# Altium footprint library hphonglib.PcbLib: 703 footprints (part 42 of 44)
Each footprint in its own frame and in the unit in brackets; x right, y up, seen from the top. Pads: shape width x height; smd on the part's side, far side on the other; paste and mask are expansions set on the pad; w line width, h text height; cw(c..) or ccw(c..) is an arc to the next point about the centre after c.
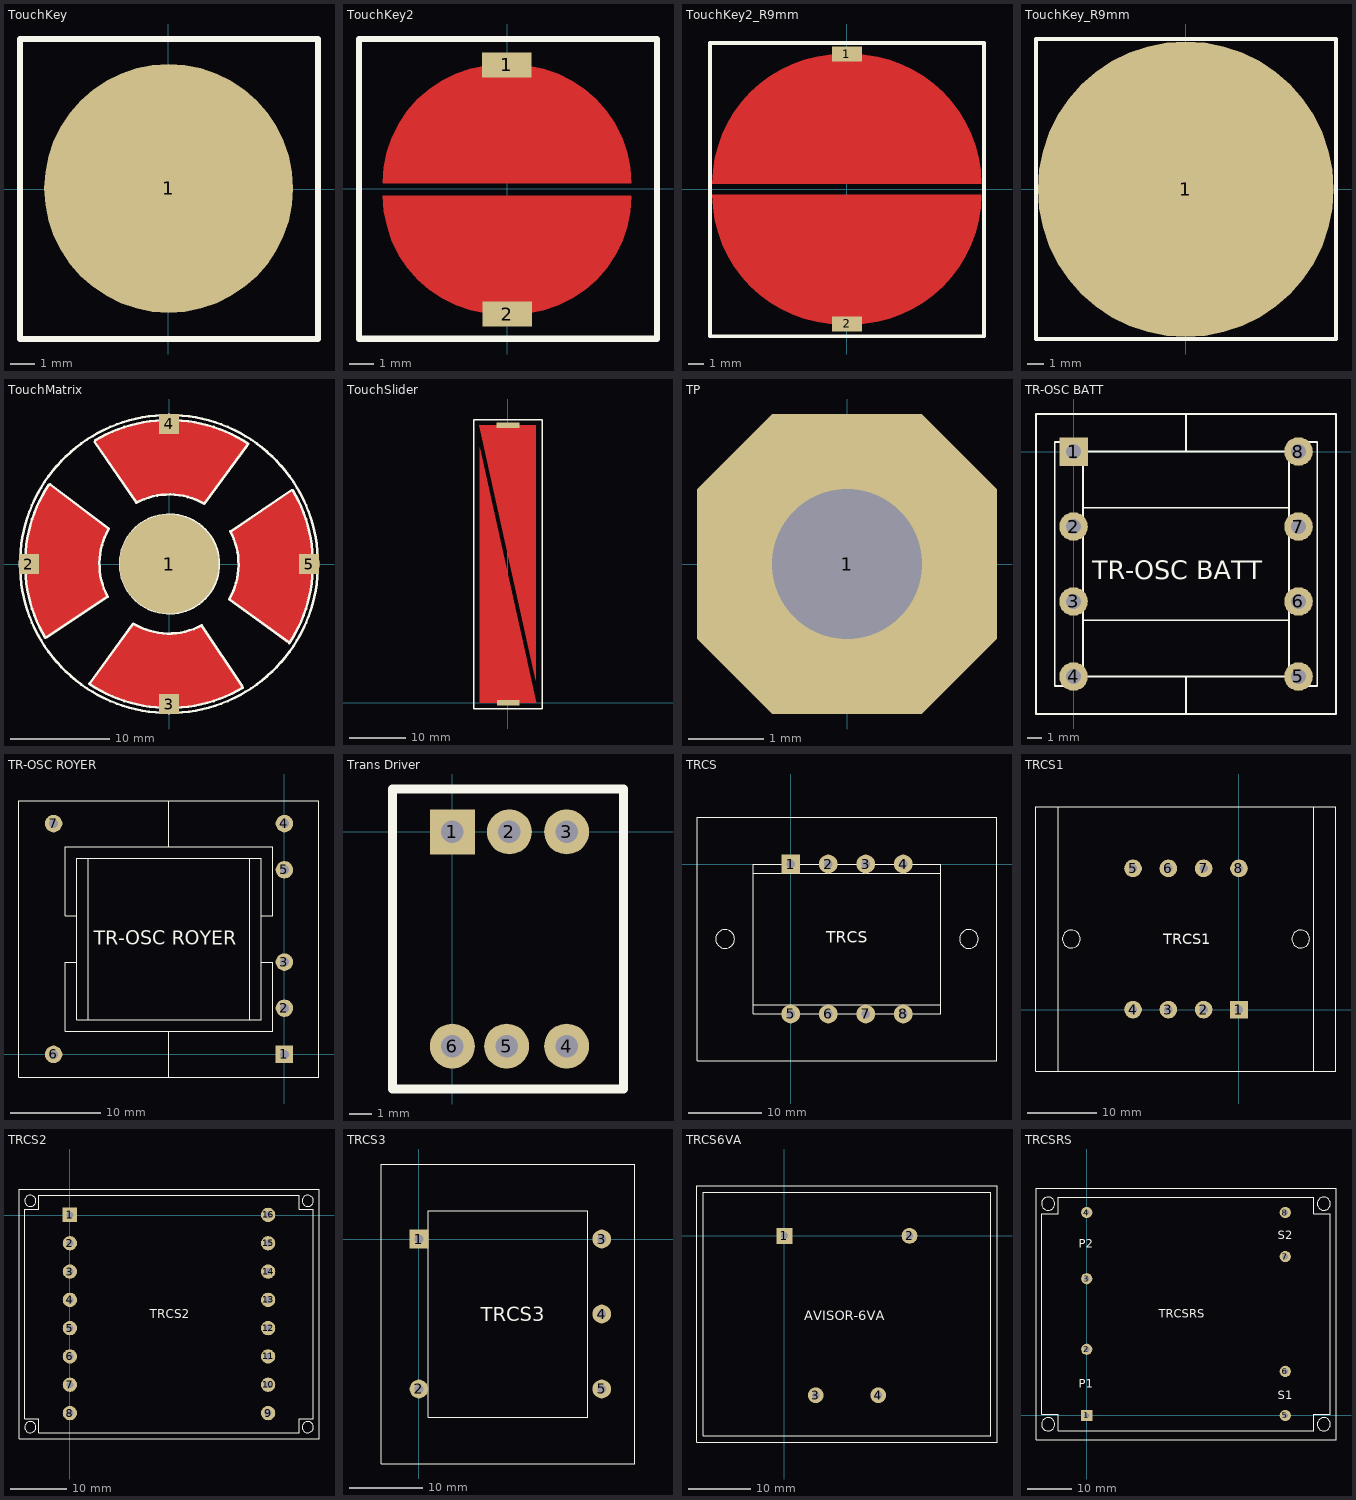
[diagram p41: the footprints below, top view; thin cyan lines are the x and y axes]

## TouchKey [mm] "Radius 5mm"
pads (1):
  round 10 smd mask+0: 1(0.025,0.025)
Top Overlay:
  lines w0.254: -5.95,-6.025 6.025,-6.025 6.025,6.025 -5.95,6.025 -5.95,-6.025

## TouchKey2 [mm] "Radius 5mm"
pads (2):
  rect 2x1 smd mask+0: 1(-0.012,4.983) 2(0.012,-5.034)
Top Layer:
  region: 0.253,-5.039 0.871,-4.999 1.479,-4.878 2.065,-4.679 2.621,-4.405 3.136,-4.061 3.601,-3.652 4.01,-3.187 4.354,-2.671 4.628,-2.116 4.827,-1.529 4.948,-0.922 4.989,-0.304 4.978,-0.304 4.978,-0.279 -4.989,-0.279 -4.948,-0.901 -4.826,-1.511 -4.626,-2.101 -4.351,-2.659 -4.005,-3.177 -3.594,-3.645 -3.126,-4.056 -2.609,-4.402 -2.05,-4.677 -1.461,-4.877 -0.85,-4.999 -0.229,-5.039 -0.229,-5.029
  region: -0.253,4.989 -0.871,4.948 -1.479,4.827 -2.065,4.628 -2.621,4.354 -3.136,4.01 -3.601,3.601 -4.01,3.136 -4.354,2.621 -4.628,2.065 -4.827,1.479 -4.948,0.871 -4.989,0.253 -4.978,0.253 -4.978,0.229 4.989,0.229 4.948,0.85 4.826,1.461 4.626,2.05 4.351,2.609 4.005,3.126 3.594,3.594 3.126,4.005 2.609,4.351 2.05,4.626 1.461,4.826 0.85,4.948 0.229,4.989 0.229,4.978
Top Overlay:
  lines w0.254: -5.95,-6.025 6.025,-6.025 6.025,6.025 -5.95,6.025 -5.95,-6.025

## TouchKey2_R9mm [mm] "Radius 9mm"
pads (2):
  rect 2x1 smd paste+0 mask+0: 1(0,8.992) 2(0.025,-8.992)
Top Layer:
  region: -0.33,8.977 -1.175,8.935 -2.012,8.811 -2.833,8.605 -3.629,8.32 -4.394,7.959 -5.12,7.524 -5.799,7.02 -6.426,6.452 -6.994,5.825 -7.498,5.145 -7.933,4.42 -8.295,3.655 -8.58,2.858 -8.786,2.037 -8.91,1.201 -8.951,0.356 -8.941,0.356 8.951,0.356 8.91,1.201 8.786,2.037 8.58,2.858 8.295,3.655 7.933,4.42 7.498,5.145 6.994,5.825 6.426,6.452 5.799,7.02 5.12,7.524 4.394,7.959 3.629,8.32 2.833,8.605 2.012,8.811 1.175,8.935 0.33,8.977 0.33,8.966
  region: 0.33,-9.002 1.175,-8.96 2.012,-8.836 2.833,-8.631 3.629,-8.346 4.394,-7.984 5.12,-7.549 5.799,-7.045 6.426,-6.477 6.994,-5.85 7.498,-5.171 7.933,-4.445 8.295,-3.68 8.58,-2.884 8.786,-2.063 8.91,-1.226 8.951,-0.381 8.941,-0.381 -8.951,-0.381 -8.91,-1.226 -8.786,-2.063 -8.58,-2.884 -8.295,-3.68 -7.933,-4.445 -7.498,-5.171 -6.994,-5.85 -6.426,-6.477 -5.799,-7.045 -5.12,-7.549 -4.394,-7.984 -3.629,-8.346 -2.833,-8.631 -2.012,-8.836 -1.175,-8.96 -0.33,-9.002 -0.33,-8.992
Top Overlay:
  lines w0.254: -9.119,-9.804 9.144,-9.804 9.144,9.728 -9.119,9.728 -9.119,-9.804

## TouchKey_R9mm [mm] "Radius 9mm"
pads (1):
  round 18 smd paste+0 mask+0: 1(0,0)
Top Overlay:
  lines w0.254: -9.119,-9.119 -9.119,9.144 9.144,9.144 9.144,-9.119 -9.119,-9.119

## TouchMatrix [mm]
pads (5):
  round 10 smd paste+0 mask+0: 1(0,0)
  rect 2x2 smd paste+0 mask+0: 2(-14.097,0) 3(0,-14.097) 4(0,14.097) 5(14.097,0)
Top Layer:
  region: -3.302,6.223 -7.366,12.192 -7.373,12.319 -7.344,12.468 -7.26,12.594 -7.134,12.678 -6.985,12.707 -6.985,12.7 -4.699,13.716 -1.905,14.351 0.635,14.478 3.175,14.097 5.08,13.589 7.62,12.324 7.719,12.304 7.803,12.248 7.859,12.164 7.879,12.065 7.874,12.065 7.874,11.811 3.556,6.096 2.54,6.604 1.27,6.858 0.254,7.112 -1.27,6.985 -2.667,6.477
  region: 6.223,3.302 12.192,7.366 12.319,7.373 12.468,7.344 12.594,7.26 12.678,7.134 12.707,6.985 12.7,6.985 13.716,4.699 14.351,1.905 14.478,-0.635 14.097,-3.175 13.589,-5.08 12.324,-7.62 12.304,-7.719 12.248,-7.803 12.164,-7.859 12.065,-7.879 12.065,-7.874 11.811,-7.874 6.096,-3.556 6.604,-2.54 6.858,-1.27 7.112,-0.254 6.985,1.27 6.477,2.667
  region: -6.223,-3.302 -12.192,-7.366 -12.319,-7.373 -12.468,-7.344 -12.594,-7.26 -12.678,-7.134 -12.707,-6.985 -12.7,-6.985 -13.716,-4.699 -14.351,-1.905 -14.478,0.635 -14.097,3.175 -13.589,5.08 -12.324,7.62 -12.304,7.719 -12.248,7.803 -12.164,7.859 -12.065,7.879 -12.065,7.874 -11.811,7.874 -6.096,3.556 -6.604,2.54 -6.858,1.27 -7.112,0.254 -6.985,-1.27 -6.477,-2.667
  region: 3.302,-6.223 7.366,-12.192 7.373,-12.319 7.344,-12.468 7.26,-12.594 7.134,-12.678 6.985,-12.707 6.985,-12.7 4.699,-13.716 1.905,-14.351 -0.635,-14.478 -3.175,-14.097 -5.08,-13.589 -7.62,-12.324 -7.719,-12.304 -7.803,-12.248 -7.859,-12.164 -7.879,-12.065 -7.874,-12.065 -7.874,-11.811 -3.556,-6.096 -2.54,-6.604 -1.27,-6.858 -0.254,-7.112 1.27,-6.985 2.667,-6.477
Top Overlay:
  circle w0.254: c0,0 r15
  circle w0.254: c0.051,0 r4.973
  lines w0.254: -12.445,-7.441 cw(c0,0) -12.099,7.992 ; -12.319,-7.366 -6.223,-3.302 ; -11.938,8.001 -6.096,3.556 ; -8.001,-12.065 -3.683,-6.096 ; -7.992,-12.099 ccw(c0,0) 7.441,-12.445 ; -7.493,12.319 -3.299,6.225 ; -7.441,12.445 cw(c0,0) 7.992,12.099 ; -6.177,-3.278 cw(c0,0.015) -6.053,3.531 ; -3.605,-6.009 ccw(c-0.015,0) 3.292,-6.17 ; -3.292,6.17 cw(c0.015,0) 3.531,6.053 ; 3.302,-6.223 7.366,-12.319 ; 3.556,6.096 7.874,11.938 ; 6.053,-3.531 ccw(c0,-0.015) 6.17,3.292 ; 6.096,-3.556 12.065,-7.874 ; 6.294,3.333 12.354,7.441 ; 12.099,-7.992 ccw(c0,0) 12.445,7.441

## TouchSlider [mm]
pads (2):
  rect 4x1 smd paste+0 mask+0: 1(0.025,0.025) 2(0,49.025)
Top Layer:
  region: 5,0.025 -5,0.05 -4.975,45.05
  region: -5.1,49.025 4.9,49 4.875,4
Top Overlay:
  lines w0.254: -6,-1.025 6.025,-1.025 6.025,50.025 -6,50.025 -6,-1.025

## TP [mm] "Test Pad, 1-Pin"
pads (1):
  oct 4x4 hole 2: 1(0,0)

## TR-OSC BATT [mil] "Transformer oscillator for battery power - E30"
pads (8):
  rect 76x76 hole 39.37 unplated: 1(0,0)
  round 76 hole 39.37 unplated: 2(0,-200) 3(0,-400) 4(0,-600) 5(600,-600) 6(600,-400) 7(600,-200) 8(600,0)
Top Overlay:
  lines w5: 25,-600 575,-600 ; 25,-450 575,-450 ; 25,-150 575,-150 ; 25,0 575,0 ; 100,0 150,0 ; 300,-700 300,-600 ; 300,0 300,100 ; -100,-700 -100,100 700,100 700,-700 -100,-700 ; -50,-625 25,-625 25,25 -50,25 -50,-625 ; 575,-625 575,25 650,25 650,-625 575,-625
  text "TR-OSC BATT" at 50,-340 h50

## TR-OSC ROYER [mil] "Transformer Royer oscillator - E30"
pads (7):
  rect 76x76 hole 39.37 unplated: 1(0,0)
  round 76 hole 39.37 unplated: 2(0,200) 3(0,400) 4(0,1000) 5(0,800) 6(-1000,0) 7(-1000,1000)
Top Overlay:
  lines w5: -900,400 -950,400 -950,100 -50,100 -50,400 -100,400 ; -900,600 -950,600 -950,900 -50,900 -50,600 -100,600 ; -850,150 -850,850 ; -500,-100 -500,100 ; -500,900 -500,1100 ; -150,150 -150,850 ; -1150,-100 150,-100 150,1100 -1150,1100 -1150,-100 ; -900,150 -100,150 -100,850 -900,850 -900,150
  text "TR-OSC ROYER" at -825,475 h60.8

## Trans Driver [mm] "driver transformer"
pads (6):
  rect 2x2 hole 1: 1(0,0)
  round 2 hole 1: 2(2.54,0) 3(5.08,0) 4(5.08,-9.525) 5(2.413,-9.525) 6(0,-9.525)
Top Overlay:
  lines w0.4: -2.667,1.905 -2.667,-11.43 7.62,-11.43 7.62,1.905 -2.54,1.905

## TRCS [mm] "Transformer Power 3VA - Body 40x32 mm"
pads (8):
  rect 2.54x2.54 hole 1.2: 1(0,0)
  round 2.54 hole 1.2: 2(5.08,0) 3(10.16,0) 4(15.24,0) 5(0,-20.32) 6(5.08,-20.32) 7(10.16,-20.32) 8(15.24,-20.32)
Top Overlay:
  circle w0.127: c24.13,-10.16 r1.27
  circle w0.127: c-8.89,-10.16 r1.27
  lines w0.127: -5.08,-19.05 20.32,-19.05 ; -5.08,-1.27 20.32,-1.27 ; -12.7,-26.67 -12.7,6.35 27.94,6.35 27.94,-26.67 -12.7,-26.67 ; -5.08,-20.32 -5.08,0 20.32,0 20.32,-20.32 -5.08,-20.32
  text "TRCS" at 4.826,-10.668 h1.54

## TRCS1 [mm] "Transformer Power 3.5VA - Body 44x38 mm - GBC TYPE"
pads (8):
  rect 2.54x2.54 hole 1.2: 1(0,0)
  round 2.54 hole 1.2: 2(-5.08,0) 3(-10.16,0) 4(-15.24,0) 5(-15.24,20.32) 6(-10.16,20.32) 7(-5.08,20.32) 8(0,20.32)
Top Overlay:
  circle w0.127: c-24.13,10.16 r1.27
  circle w0.127: c8.89,10.16 r1.27
  lines w0.127: -26.035,-8.89 -26.035,29.21 ; 10.795,-8.89 10.795,29.21 ; -29.21,-8.89 13.97,-8.89 13.97,29.21 -29.21,29.21 -29.21,-8.89
  text "TRCS1" at -10.922,9.398 h1.54

## TRCS2 [mil] "Transformer Power 5VA - Body 54x44 mm"
pads (16):
  rect 100x100 hole 47.24: 1(0,3)
  round 100 hole 47.24: 2(0,-194) 3(0,-391) 4(0,-588) 5(0,-784) 6(0,-981) 7(0,-1178) 8(0,-1375) 9(1378,-1375) 10(1378,-1178) 11(1378,-981) 12(1378,-784) 13(1378,-588) 14(1378,-391) 15(1378,-194) 16(1378,3)
Top Overlay:
  circle w5: c-276,101 r39
  circle w5: c-276,-1473 r39
  circle w5: c1654,-1473 r39
  circle w5: c1654,101 r39
  lines w5: -354,-1552 -354,180 1732,180 1732,-1552 -354,-1552 ; -315,-1414 -315,42 -217,42 -217,141 1594,141 1594,42 1693,42 1693,-1414 1594,-1414 1594,-1513 -217,-1513 -217,-1414 -315,-1414
  text "TRCS2" at 553.91,-716.02 h60.04

## TRCS3 [mm] "Transformer Power 3VA - Body 40x35 mm"
pads (5):
  rect 2.54x2.54 hole 1.2: 1(0,0)
  round 2.54 hole 1.2: 2(0,-20.32) 3(24.765,0) 4(24.765,-10.16) 5(24.765,-20.32)
Top Overlay:
  lines w0.127: -5.08,-30.48 29.21,-30.48 29.21,10.16 -5.08,10.16 -5.08,-30.48 ; 1.27,-24.13 22.86,-24.13 22.86,3.81 1.27,3.81 1.27,-24.13
  text "TRCS3" at 8.357,-11.125 h1.93

## TRCS6VA [mm] "Transformer"
pads (4):
  rect 2.54x2.54 hole 1.2: 1(0,0)
  round 2.54 hole 1.2: 2(20,0) 3(5,-25.5) 4(15,-25.5)
Top Overlay:
  lines w0.127: -14,-33 34,-33 34,8 -14,8 -14,-33 ; -13,-32 33,-32 33,7 -13,7 -13,-32
  text "AVISOR-6VA" at 3.175,-13.462 h1.54

## TRCSRS [mm] "Transformer Power 6VA - Body 68x57 mm RS type"
pads (8):
  rect 2.54x2.54 hole 1.2: 1(0,0)
  round 2.54 hole 1.2: 2(0,15) 3(0,31) 4(0,46) 5(45,0) 6(45,10) 7(45,36) 8(45,46)
Top Overlay:
  circle w0.127: c53.75,-2 r1.5
  circle w0.127: c53.75,48 r1.5
  circle w0.127: c-8.75,48 r1.5
  circle w0.127: c-8.75,-2 r1.5
  lines w0.127: -11.5,-5.5 -11.5,51.5 56.5,51.5 56.5,-5.5 -11.5,-5.5 ; -10.25,0.25 -10.25,45.75 -6.5,45.75 -6.5,49.5 51.5,49.5 51.5,45.75 55.25,45.75 55.25,0.25 51.5,0.25 51.5,-3.5 -6.5,-3.5 -6.5,0.25 -10.25,0.25
  text "S1" at 43.278,3.695 h1.93
  text "S2" at 43.278,39.89 h1.93
  text "P1" at -1.807,6.235 h1.93
  text "P2" at -1.807,37.985 h1.93
  text "TRCSRS" at 16.308,22.11 h1.93